# Altium footprint library ProjCLib.PcbLib: 55 footprints (part 4 of 4)
Each footprint in its own frame and in the unit in brackets; x right, y up, seen from the top. Pads: shape width x height; smd on the part's side, far side on the other; paste and mask are expansions set on the pad; w line width, h text height; cw(c..) or ccw(c..) is an arc to the next point about the centre after c.
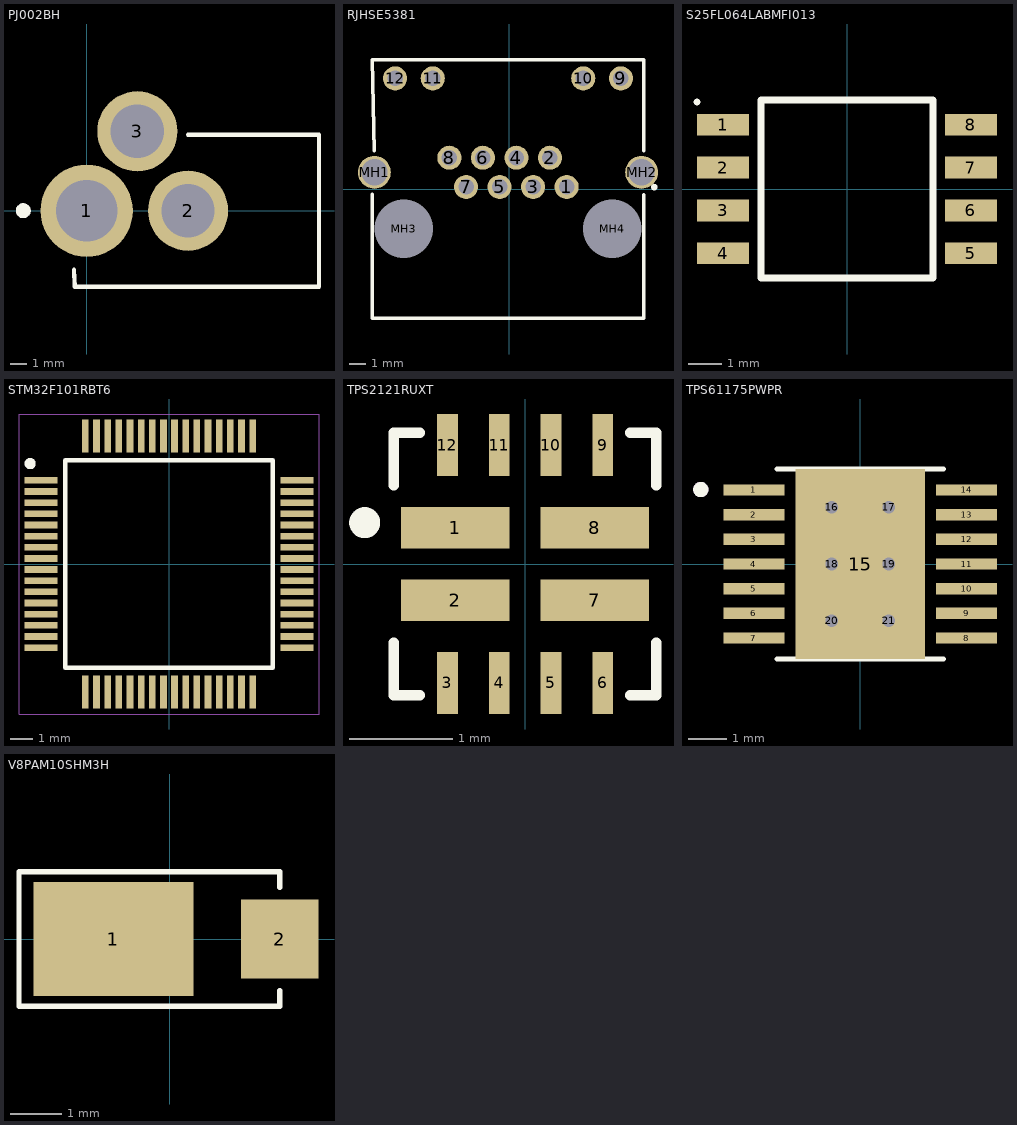
[diagram p3: the footprints below, top view; thin cyan lines are the x and y axes]

## PJ002BH [mm]
pads (3):
  round 5.46 hole 3.64: 1(0,0)
  round 4.74 hole 3.16: 2(6,0) 3(3,4.7)
Top Overlay:
  circle w0.381: c-3.75,0 r0.254
  lines w0.2: -3.8,0 ccw(c-3.75,0) -3.7,0 ccw(c-3.75,0) -3.8,0
  lines w0.254: -0.75,-3.5 -0.7,-4.5 13.75,-4.5 13.75,4.5 6,4.5
3D body "CUI_DEVICES_PJ-002BH.step": height 11.36, standoff -3.14, extent -0.735,-4.573 13.665,4.827

## RJHSE5381 [mm]
pads (16):
  round 1.462 hole 0.94: 1(3.501,0.125) 2(2.481,1.905) 3(1.461,0.125) 4(0.441,1.905) 5(-0.579,0.125) 6(-1.599,1.905) 7(-2.619,0.125) 8(-3.639,1.905) 9(6.801,6.735) 10(4.511,6.735) 11(-4.649,6.735) 12(-6.939,6.735)
  round 2 hole 1.6: MH1(-8.199,1.015) MH2(8.061,1.015)
  round 1.65 hole 3.556 unplated: MH3(-6.419,-2.415) MH4(6.281,-2.415)
Top Overlay:
  lines w0.2: 8.831,0.015 ccw(c8.831,0.115) 8.831,0.215 ccw(c8.831,0.115) 8.831,0.015
  lines w0.203: -8.324,-0.305 -8.324,-7.875 8.186,-7.875 8.186,-0.33 ; -8.205,2.312 -8.324,7.875 8.186,7.875 8.186,2.311
3D body "RJHSE-5381.step": height 16.37, standoff -2.47, extent -8.474,-8.126 8.357,8.077

## S25FL064LABMFI013 [mm]
pads (8):
  rect 1.55x0.65 smd: 1(-3.675,1.905) 2(-3.675,0.635) 3(-3.675,-0.635) 4(-3.675,-1.905) 5(3.675,-1.905) 6(3.675,-0.635) 7(3.675,0.635) 8(3.675,1.905)
Top Overlay:
  lines w0.2: -4.45,2.58 -4.448,2.58 ; -2.55,-2.64 2.55,-2.64 2.55,2.64 -2.55,2.64 -2.55,-2.64
3D body "S25FL064LABMFI013.stp": height 2.16, standoff 0, extent -4,-2.64 4,2.64

## STM32F101RBT6 [mm]
pads (64):
  rect 1.475x0.3 smd: 1(-5.738,3.75) 2(-5.738,3.25) 3(-5.738,2.75) 4(-5.738,2.25) 5(-5.738,1.75) 6(-5.738,1.25) 7(-5.738,0.75) 8(-5.738,0.25) 9(-5.738,-0.25) 10(-5.738,-0.75) 11(-5.738,-1.25) 12(-5.738,-1.75) 13(-5.738,-2.25) 14(-5.738,-2.75) 15(-5.738,-3.25) 16(-5.738,-3.75) 33(5.738,-3.75) 34(5.738,-3.25) 35(5.738,-2.75) 36(5.738,-2.25) 37(5.738,-1.75) 38(5.738,-1.25) 39(5.738,-0.75) 40(5.738,-0.25) 41(5.738,0.25) 42(5.738,0.75) 43(5.738,1.25) 44(5.738,1.75) 45(5.738,2.25) 46(5.738,2.75) 47(5.738,3.25) 48(5.738,3.75)
  rect 0.3x1.475 smd: 17(-3.75,-5.738) 18(-3.25,-5.738) 19(-2.75,-5.738) 20(-2.25,-5.738) 21(-1.75,-5.738) 22(-1.25,-5.738) 23(-0.75,-5.738) 24(-0.25,-5.738) 25(0.25,-5.738) 26(0.75,-5.738) 27(1.25,-5.738) 28(1.75,-5.738) 29(2.25,-5.738) 30(2.75,-5.738) 31(3.25,-5.738) 32(3.75,-5.738) 49(3.75,5.738) 50(3.25,5.738) 51(2.75,5.738) 52(2.25,5.738) 53(1.75,5.738) 54(1.25,5.738) 55(0.75,5.738) 56(0.25,5.738) 57(-0.25,5.738) 58(-0.75,5.738) 59(-1.25,5.738) 60(-1.75,5.738) 61(-2.25,5.738) 62(-2.75,5.738) 63(-3.25,5.738) 64(-3.75,5.738)
Top Overlay:
  circle w0.25: c-6.225,4.5 r0.125
  lines w0.2: -4.65,-4.65 4.65,-4.65 4.65,4.65 -4.65,4.65 -4.65,-4.65
Mechanical 20:
  lines w0.05: -6.725,-6.725 6.725,-6.725 6.725,6.725 -6.725,6.725 -6.725,-6.725
3D body "STM32F101RBT6.stp": height 1.6, standoff 0, extent -6,-6 6,6

## TPS2121RUXT [mm]
pads (12):
  rect 1.05x0.4 smd: 1(-0.675,0.35) 2(-0.675,-0.35) 7(0.675,-0.35) 8(0.675,0.35)
  rect 0.2x0.6 smd: 3(-0.75,-1.15) 4(-0.25,-1.15) 5(0.25,-1.15) 6(0.75,-1.15) 9(0.75,1.15) 10(0.25,1.15) 11(-0.25,1.15) 12(-0.75,1.15)
Top Overlay:
  lines w0.102: -1.27,-0.762 -1.27,-1.27 -1.016,-1.27 ; -1.27,0.762 -1.27,1.27 -1.016,1.27 ; 1.016,-1.27 1.27,-1.27 1.27,-0.762 ; 1.016,1.27 1.27,1.27 1.27,0.762
  lines w0.2: -1.6,0.4 cw(c-1.55,0.4) -1.5,0.4 cw(c-1.55,0.4) -1.6,0.4
3D body "TPS2121RUXT.stp": height 1.1, standoff 0, extent -1,-1.25 1,1.25

## TPS61175PWPR [mm]
pads (21):
  rect 1.6x0.3 smd paste-2: 1(-2.8,1.95) 2(-2.8,1.3) 3(-2.8,0.65) 4(-2.8,0) 5(-2.8,-0.65) 6(-2.8,-1.3) 7(-2.8,-1.95) 8(2.8,-1.95) 9(2.8,-1.3) 10(2.8,-0.65) 11(2.8,0) 12(2.8,0.65) 13(2.8,1.3) 14(2.8,1.95)
  rect 3.4x5 smd paste-3 mask+0: 15(0,0)
  round 0.44 hole 0.33 mask+0: 16(-0.75,1.5) 17(0.75,1.5) 20(-0.75,-1.5) 21(0.75,-1.5)
  round 0.44 hole 0.33: 18(-0.75,0) 19(0.75,0)
Top Overlay:
  circle w0.2: c-4.2,1.96 r0.1
  lines w0.127: -2.2,-2.5 2.2,-2.5 ; -2.2,2.5 2.2,2.5
Top Paste:
  region: 3.575,-0.125 2.025,-0.125 2.025,0.125 3.575,0.125
  region: 3.575,-0.775 2.025,-0.775 2.025,-0.525 3.575,-0.525
  region: 3.575,-1.425 2.025,-1.425 2.025,-1.175 3.575,-1.175
  region: 3.575,-2.075 2.025,-2.075 2.025,-1.825 3.575,-1.825
  region: 3.575,0.525 2.025,0.525 2.025,0.775 3.575,0.775
  region: 3.575,1.175 2.025,1.175 2.025,1.425 3.575,1.425
  region: 3.575,1.825 2.025,1.825 2.025,2.075 3.575,2.075
  region: -2.025,-0.125 -3.575,-0.125 -3.575,0.125 -2.025,0.125
  region: -2.025,-0.775 -3.575,-0.775 -3.575,-0.525 -2.025,-0.525
  region: -2.025,-1.425 -3.575,-1.425 -3.575,-1.175 -2.025,-1.175
  region: -2.025,-2.075 -3.575,-2.075 -3.575,-1.825 -2.025,-1.825
  region: -2.025,0.525 -3.575,0.525 -3.575,0.775 -2.025,0.775
  region: -2.025,1.175 -3.575,1.175 -3.575,1.425 -2.025,1.425
  region: -2.025,1.825 -3.575,1.825 -3.575,2.075 -2.025,2.075
  region: 1.23,-1.155 -1.23,-1.155 -1.23,1.155 1.23,1.155
Top Solder:
  region: 1.23,-1.155 -1.23,-1.155 -1.23,1.155 1.23,1.155
Mechanical 13:
  circle w0.2: c-4.2,1.96 r0.1
3D body "TPS61175PWPR--3DModel-STEP-56544.STEP": height 1.2, standoff 0, extent -3.2,-2.5 3.2,2.5

## V8PAM10SHM3H [mm]
pads (2):
  rect 3.1x2.2 smd: 1(-1.095,0)
  rect 1.5x1.52 smd: 2(2.125,0)
Top Overlay:
  lines w0.1: -2.921,1.27 -2.921,-1.3 2.125,-1.3 2.125,-1 ; -2.921,1.3 2.125,1.3 2.125,1
3D body "V8PAM10S-M3_H.stp": height 1.1, standoff 0, extent -2.425,-1.3 2.725,1.3